# Altium footprint library BIOSCOPE-LIB.PcbLib: 33 footprints (part 1 of 3)
Each footprint in its own frame and in the unit in brackets; x right, y up, seen from the top. Pads: shape width x height; smd on the part's side, far side on the other; paste and mask are expansions set on the pad; w line width, h text height; cw(c..) or ccw(c..) is an arc to the next point about the centre after c.
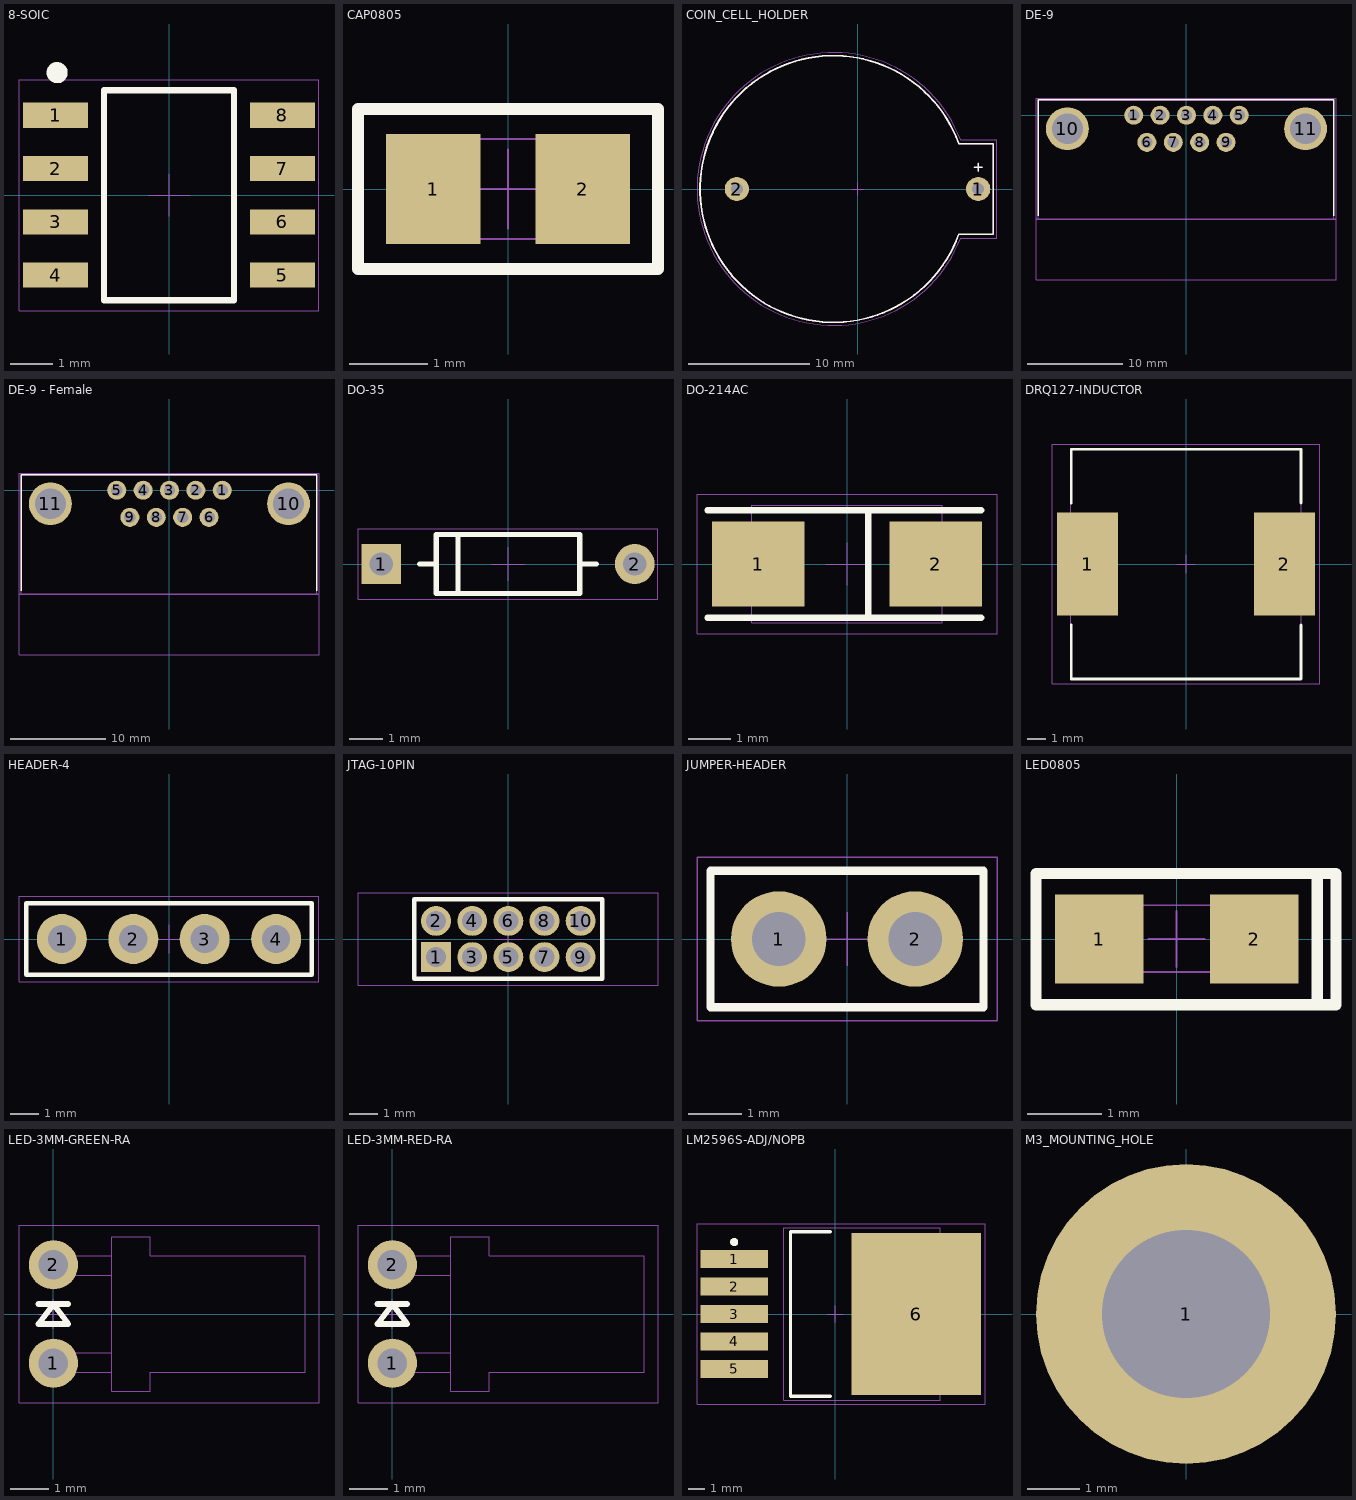
[diagram p0: the footprints below, top view; thin cyan lines are the x and y axes]

## 8-SOIC [mm]
pads (8):
  rect 1.55x0.6 smd: 1(-2.7,1.905) 2(-2.7,0.635) 3(-2.7,-0.635) 4(-2.7,-1.905) 5(2.7,-1.905) 6(2.7,-0.635) 7(2.7,0.635) 8(2.7,1.905)
Top Overlay:
  circle w0.25: c-2.667,2.921 r0.125
  lines w0.152: -1.55,-2.5 -1.55,2.5 1.55,2.5 1.55,-2.5 -1.55,-2.5
Top Courtyard:
  lines w0.025: -3.575,-2.75 -3.575,2.75 ; -3.575,-2.75 3.575,-2.75 ; -3.575,-2.75 3.575,-2.75 ; -3.575,-2.75 -3.575,2.75 ; -3.575,2.75 3.575,2.75 ; -3.575,2.75 3.575,2.75 ; 3.575,-2.75 3.575,2.75 ; 3.575,-2.75 3.575,2.75
Top Designator:
  text ".Designator" at -2.252,-0.226 h1
Top Assembly (Mech15):
  lines w0.025: -0.5,0 0.5,0 ; 0,-0.5 0,0.5 ; -1.55,-2.5 1.55,-2.5 1.55,2.5 -1.55,2.5 -1.55,-2.5
3D body "IC_Microchip_PIC16F15313T-I-SN_eec.STEP": height 0.25, standoff 0, extent -3.575,-2.75 3.575,2.75

## CAP0805 [mm] "Pasivo 0805"
height 0.7
pads (2):
  rect 1.2x1.4 smd: 1(-0.95,0) 2(0.95,0)
Top Overlay:
  lines w0.152: -1.905,-1.016 1.905,-1.016 1.905,1.016 -1.905,1.016 -1.905,-1.016
Top Courtyard:
  lines w0.025: -1.905,-1.016 -1.905,1.016 1.905,1.016 1.905,-1.016 -1.905,-1.016
Top Designator:
  text ".Designator" at -1.714,-0.172 h0.76
Top Assembly (Mech15):
  lines w0.025: -0.5,0 0.5,0 ; 0,-0.5 0,0.5 ; -1.016,-0.635 1.009,-0.635 1.009,0.635 -1.016,0.635 -1.016,-0.635
3D body "User Library-Chip Cap_MLCC_0805 (2012)_B.step": height 0.8, standoff 0, extent -1,-0.63 1,0.62

## COIN_CELL_HOLDER [mm] "BH-25C-1"
pads (2):
  round 2 hole 1: 1(10,0) 2(-10,0)
Top Overlay:
  lines w0.152: 9.7,1.8 10.3,1.8 ; 10,1.5 10,2.1 ; 11.25,-3.75 8.396,-3.75 11.25,-3.75 ; 11.25,-3.75 11.25,3.75 ; 11.25,-3.75 11.25,3.75 ; 11.25,3.75 8.383,3.75 11.25,3.75 ; 8.383,3.78 ccw(c-2,0) 8.394,-3.749 cw(c-2,0) 8.383,3.78
Top Courtyard:
  lines w0.025: 8.548,-4.064 cw(c-2,0) 8.548,4.064 11.557,4.064 11.557,-4.064 8.548,-4.064
Top Designator:
  text ".Designator" at -4.579,-0.46 h2.03
Top Assembly (Mech15):
  lines w0.025: 11.25,-3.75 11.25,3.75 ; 11.25,-3.75 8.396,-3.75 11.25,-3.75 ; 11.25,-3.75 11.25,3.75 ; 11.25,3.75 8.383,3.75 11.25,3.75 ; 8.383,3.78 ccw(c-2,0) 8.394,-3.749 cw(c-2,0) 8.383,3.78
  lines w0.1: -0.5,0 0.5,0 ; 0,-0.5 0,0.5
3D body "XB-02-A1AK001.step": height 8.77, standoff -4.2, extent -13.05,-11.05 11.25,11.05

## DE-9 [mm]
pads (11):
  round 2 hole 1.2: 1(-5.537,0) 2(-2.769,0) 3(0,0) 4(2.769,0) 5(5.537,0) 6(-4.153,-2.845) 7(-1.384,-2.845) 8(1.384,-2.845) 9(4.153,-2.845)
  round 4.5 hole 3.25: 10(-12.497,-1.422) 11(12.497,-1.422)
Top Overlay:
  lines w0.152: -15.545,-10.541 -15.545,1.6 15.443,1.6 15.443,-10.541
Top Courtyard:
  lines w0.025: -15.799,-17.272 -15.799,1.778 15.697,1.778 15.697,-17.272 -15.799,-17.272
  lines w0.152: -15.799,-10.922 15.697,-10.922
Top Designator:
  text ".Designator" at -3.434,-0.345 h1.52
Top Assembly (Mech15):
  lines w0.025: -15.545,-10.922 15.443,-10.922 15.443,1.6 -15.545,1.6 -15.545,-10.922
  lines w0.1: -0.5,0 0.5,0 ; 0,-0.5 0,0.5
3D body "182-009-113.STEP": height 12.55, standoff -3.17, extent -15.456,-16.967 15.354,1.524

## DE-9 - Female [mm]
pads (11):
  round 2 hole 1.2: 1(5.537,0) 2(2.769,0) 3(0,0) 4(-2.769,0) 5(-5.537,0) 6(4.153,-2.845) 7(1.384,-2.845) 8(-1.384,-2.845) 9(-4.153,-2.845)
  round 4.5 hole 3.25: 10(12.497,-1.422) 11(-12.497,-1.422)
Top Overlay:
  lines w0.152: -15.545,-10.541 -15.545,1.6 15.443,1.6 15.443,-10.541
Top Courtyard:
  lines w0.025: -15.799,-17.272 15.697,-17.272 15.697,1.778 -15.799,1.778 -15.799,-17.272
  lines w0.152: -15.799,-10.922 15.697,-10.922
Top Designator:
  text ".Designator" at -3.434,-0.345 h1.52
Top Assembly (Mech15):
  lines w0.025: -15.545,-10.922 -15.545,1.6 15.443,1.6 15.443,-10.922 -15.545,-10.922
  lines w0.1: -0.5,0 0.5,0 ; 0,-0.5 0,0.5
3D body "182-009-213.STEP": height 12.55, standoff -3.17, extent -15.456,-16.993 15.354,1.524

## DO-35 [mm]
pads (2):
  rect 1.2x1.2 hole 0.7: 1(-3.813,0)
  round 1.2 hole 0.7: 2(3.813,0)
Top Overlay:
  lines w0.152: -2.667,0 -2.159,0 ; -1.5,-0.855 -1.5,0.855 ; 2.159,0 2.667,0 ; -2.159,-0.889 -2.159,0.889 2.159,0.889 2.159,-0.889 -2.159,-0.889
Top Courtyard:
  lines w0.025: -4.513,-1.055 -4.513,1.055 4.513,1.055 4.513,-1.055 -4.513,-1.055
Top Designator:
  text ".Designator" at -2.252,-0.226 h1
Top Assembly (Mech15):
  lines w0.025: -0.5,0 0.5,0 ; 0,-0.5 0,0.5 ; -2.159,-0.889 2.159,-0.889 2.159,0.889 -2.159,0.889 ; -2.159,-0.889 -2.159,0.889 ; -2.159,-0.889 -2.159,0.889
3D body "Diode_ON_Semiconductor_1N5245BTR_eec.STEP": height 0.25, standoff 0, extent -4.513,-1.055 4.513,1.055

## DO-214AC [mm] "DO-214AC, 2-Leads, Body 4.5x2.79mm, IPC Low Density"
height 2.29
pads (2):
  rect 2.2x2 smd: 1(-2.1,0) 2(2.1,0)
Top Overlay:
  lines w0.152: -3.302,-1.27 3.175,-1.27 ; -3.302,1.27 3.175,1.27 ; 0.508,-1.27 0.508,1.27
Top Courtyard:
  lines w0.025: -3.55,-1.651 3.55,-1.651 3.55,1.651 -3.55,1.651 -3.55,-1.651
Top Designator:
  text ".Designator" at -1.714,-0.172 h0.76
Top Assembly (Mech15):
  lines w0.025: -0.5,0 0.5,0 ; 0,-0.5 0,0.5 ; -2.25,-1.395 2.25,-1.395 2.25,1.395 -2.25,1.395 -2.25,-1.395
3D body: height 2.29, standoff 0, extent -2.25,-1.395 2.25,1.395

## DRQ127-INDUCTOR [mil]
pads (2):
  rect 130x220 smd: 1(-210,0) 2(210,0)
Top Overlay:
  lines w6: -245,-130 -245,-245 245,-245 245,-130 ; -245,130 -245,245 245,245 245,130
Top Courtyard:
  lines w1: -285,-255 -285,255 285,255 285,-255 -285,-255
Top Designator:
  text ".Designator" at -135.2,-13.57 h60
Top Assembly (Mech15):
  lines w1: -19.68,0 19.68,0 ; 0,-19.69 0,19.68 ; -246.07,-246.06 246.06,-246.06 246.06,246.07 -246.07,246.07 -246.07,-246.06
3D body "User Library-DRQ127_12_5x12_5.step": height 316.28, standoff 1.31, extent -246.07,-246.06 246.06,246.07

## HEADER-4 [mil] "Pin Header 4-pos"
pads (4):
  round 70 hole 39.37: 1(-150,0) 2(-50,0) 3(50,0) 4(150,0)
Top Overlay:
  lines w6: -200,-50 0,-50 200,-50 200,50 0,50 -200,50 -200,-50
Top Courtyard:
  lines w1: -10,-60 210,-60 210,60 -10,60 ; 10,-60 -210,-60 -210,60 10,60
Top Designator:
  text ".Designator" at -67.48,-6.77 h30
Top Assembly (Mech15):
  lines w1: -19.68,0 19.68,0 ; 0,-19.69 0,19.68 ; -200,-50 0,-50 200,-50 200,50 0,50 -200,50 -200,-50
3D body "User Library-HEADER 1x1 Pitch 2_54x2_54.step": height 329.92, standoff -114.96, extent 100,-50 200,50
3D body "User Library-HEADER 1x1 Pitch 2_54x2_54.step": height 329.92, standoff -114.96, extent 0,-50 100,50
3D body "User Library-HEADER 1x1 Pitch 2_54x2_54.step": height 329.92, standoff -114.96, extent -100,-50 0,50
3D body "User Library-HEADER 1x1 Pitch 2_54x2_54.step": height 329.92, standoff -114.96, extent -200,-50 -100,50

## JTAG-10PIN [mm] "10 pin JTAG header with male connector"
pads (10):
  rect 1.05x1.05 hole 0.7 mask+0.051: 1(-2.54,-0.635)
  round 1.05 hole 0.7 mask+0.051: 2(-2.54,0.635) 3(-1.27,-0.635) 4(-1.27,0.635) 5(0,-0.635) 6(0,0.635) 7(1.27,-0.635) 8(1.27,0.635) 9(2.54,-0.635) 10(2.54,0.635)
Top Overlay:
  lines w0.152: -3.302,-1.397 3.302,-1.397 3.302,1.397 -3.302,1.397 -3.302,-1.397
Top Courtyard:
  lines w0.025: -5.282,-1.625 5.258,-1.625 5.258,1.625 -5.282,1.625 -5.282,-1.625
Top Designator:
  text ".Designator" at -1.714,-0.187 h0.76
Top Assembly (Mech15):
  lines w0.025: -0.5,-0.015 0.5,-0.015 ; 0,-0.515 0,0.485 ; -3.302,-1.397 -3.302,1.397 3.302,1.397 3.302,-1.397 -3.302,-1.397
3D body "2x5_50mils.step": height 5.48, standoff -2.17, extent -5.282,-1.625 5.258,1.625

## JUMPER-HEADER [mil]
pads (2):
  round 70 hole 39.37: 1(-50,0) 2(50,0)
Top Overlay:
  lines w6: -100,-50 -100,50 100,50 100,-50 -100,-50
Top Courtyard:
  lines w1: -110,-60 -110,60 110,60 110,-60 -110,-60
Top Designator:
  text ".Designator" at -88.67,-8.9 h39.37
Top Assembly (Mech15):
  lines w1: -19.68,0 19.68,0 ; 0,-19.69 0,19.68 ; -100,-50 -100,50 100,50 100,-50 -100,-50
3D body "User Library-Mini Jumper.step": height 635.83, standoff 104.33, extent -99.41,-50 99.41,44.1
3D body "User Library-HEADER 1x1 Pitch 2_54x2_54.step": height 329.92, standoff -114.96, extent -100,-50 0,50
3D body "User Library-HEADER 1x1 Pitch 2_54x2_54.step": height 329.92, standoff -114.96, extent 0,-50 100,50

## LED0805 [mm] "LED SMD 0805"
height 0.7
pads (2):
  rect 1.2x1.2 smd: 1(-1.05,0) 2(1.05,0)
Top Overlay:
  lines w0.152: 1.905,-0.889 -1.905,-0.889 -1.905,0.889 1.905,0.889 ; 1.905,-0.889 1.905,0.889 ; 1.905,-0.889 2.159,-0.889 2.159,0.889 1.905,0.889
Top Courtyard:
  lines w0.025: -1.905,-0.889 1.905,-0.889 1.905,0.889 -1.905,0.889 -1.905,-0.889
Top Designator:
  text ".Designator" at -1.714,-0.172 h0.76
Top Assembly (Mech15):
  lines w0.025: -0.381,0 0.381,0 ; 0,-0.381 0,0.381 ; -1.031,-0.449 1.031,-0.449 1.031,0.457 -1.031,0.457 -1.031,-0.449
3D body "LED0805.step": height 0.85, standoff 0.01, extent -1.031,-0.449 1.031,0.457

## LED-3MM-GREEN-RA [mil] "LED 3mm Right Angle"
pads (2):
  round 50 hole 30: 1(0,-50) 2(0,50)
Top Overlay:
  lines w6: -15,10 15,10 ; -15,-10 15,-10 0,10 -15,-10
Top Courtyard:
  lines w1: -35,-90 270,-90 270,90 -35,90 -35,-90
Top Designator:
  text ".Designator" at -67.48,-6.77 h30
Top Assembly (Mech15):
  lines w1: -15,0 15,0 ; 0,-15 0,15 ; 59.06,-59.06 -9.84,-59.06 -9.84,-39.37 59.06,-39.37 ; 59.06,39.37 -9.84,39.37 -9.84,59.06 59.06,59.06 ; 59.06,-78.74 59.06,78.74 98.43,78.74 98.43,59.06 255.91,59.06 255.91,-59.06 98.43,-59.06 98.43,-78.74 59.06,-78.74
3D body "LED_3mm_clear_recentered.stp": height 0, standoff 0, extent 335,-15 335,-15
3D body "LED_3mm_green.step": height 164.73, standoff -71.49, extent -9.56,-78.74 256.19,78.74

## LED-3MM-RED-RA [mil] "LED 3mm Right Angle"
pads (2):
  round 50 hole 30: 1(0,-50) 2(0,50)
Top Overlay:
  lines w6: -15,10 15,10 ; -15,-10 0,10 15,-10 -15,-10
Top Courtyard:
  lines w1: -35,-90 -35,90 270,90 270,-90 -35,-90
Top Designator:
  text ".Designator" at -67.48,-6.77 h30
Top Assembly (Mech15):
  lines w1: -15,0 15,0 ; 0,-15 0,15 ; 59.06,-59.06 -9.84,-59.06 -9.84,-39.37 59.06,-39.37 ; 59.06,39.37 -9.84,39.37 -9.84,59.06 59.06,59.06 ; 59.06,-78.74 98.43,-78.74 98.43,-59.06 255.91,-59.06 255.91,59.06 98.43,59.06 98.43,78.74 59.06,78.74 59.06,-78.74
3D body "LED_3mm_clear_recentered.stp": height 0, standoff 0, extent 335,-15 335,-15
3D body "LED_3mm_red.step": height 164.73, standoff -71.49, extent -9.56,-78.74 256.19,78.74

## LM2596S-ADJ/NOPB [mm] "DPAK, 5-Leads, Body 10.65x9.65mm, Pitch 1.7mm, IPC Medium Density"
height 4.83
pads (6):
  rect 4.15x1.1 smd: 1(-6.25,3.4) 2(-6.25,1.7) 3(-6.25,0) 4(-6.25,-1.7) 5(-6.25,-3.4)
  rect 8x10 smd: 6(5,0)
Top Overlay:
  circle w0.25: c-6.25,4.45 r0.125
  lines w0.2: -0.3,-5.08 -2.769,-5.08 -2.769,5.08 -0.3,5.08
Top Courtyard:
  lines w0.025: -8.55,-5.575 9.271,-5.575 9.271,5.575 -8.55,5.575 -8.55,-5.575
Top Designator:
  text ".Designator" at -0.345,3.434 h1.52
Top Assembly (Mech15):
  lines w0.025: -0.5,0 0.5,0 ; 0,-0.5 0,0.5 ; -3.175,-5.334 6.477,-5.334 6.477,5.334 -3.175,5.334 -3.175,-5.334
3D body "LM2596S-ADJ.step": height 4.65, standoff -0.15, extent -7.175,-5.08 7.175,5.08

## M3_MOUNTING_HOLE [mm]
pads (1):
  round 5.7 hole 3.2: 1(0,0)